# Altium footprint library Libreria_Organo.PcbLib: 19 footprints (part 1 of 2)
Each footprint in its own frame and in the unit in brackets; x right, y up, seen from the top. Pads: shape width x height; smd on the part's side, far side on the other; paste and mask are expansions set on the pad; w line width, h text height; cw(c..) or ccw(c..) is an arc to the next point about the centre after c.
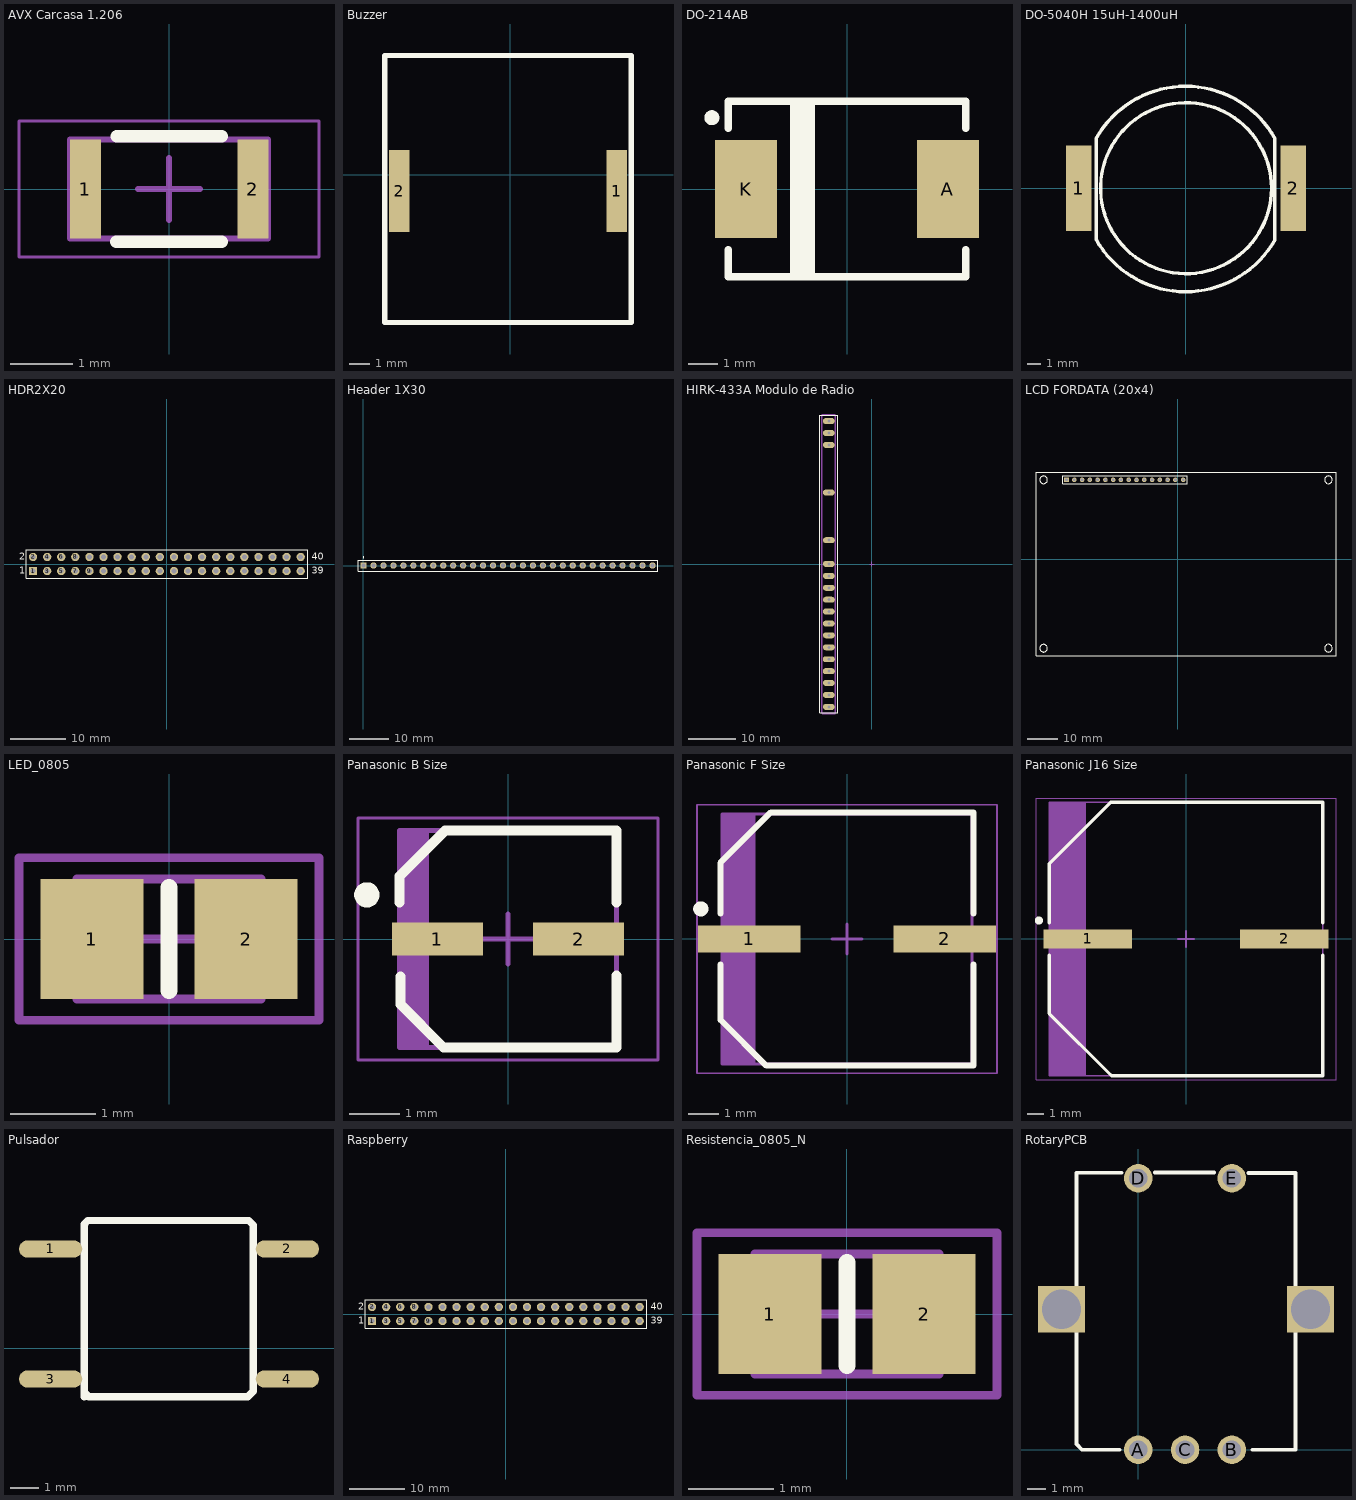
[diagram p0: the footprints below, top view; thin cyan lines are the x and y axes]

## AVX Carcasa 1.206 [mm] "Molded Capacitor, 2-Leads, Body 3,20x1,60mm, IPC Medium Density"
height 3.4
pads (2):
  rect 0.5x1.6 smd: 1(-1.352,0) 2(1.357,0)
Top Overlay:
  lines w0.2: -0.85,-0.85 -0.475,-0.85 0.475,-0.85 0.855,-0.85 ; -0.845,0.85 -0.475,0.85 0.475,0.85 0.855,0.85
Mechanical 13:
  lines w0.1: -1.6,-0.8 -1.6,0.8 1.6,0.8 1.6,-0.8 -1.6,-0.8
Mechanical 15:
  lines w0.05: -2.425,-1.1 -2.425,1.1 2.425,1.1 2.425,-1.1 -2.425,-1.1
  lines w0.1: -0.5,0 0.5,0 ; 0,-0.5 0,0.5
3D body: height 1.71, standoff 0, extent -1.7,-0.835 1.7,0.845

## Buzzer [mm]
pads (2):
  rect 1x4 smd: 1(5.2,-0.8) 2(-5.4,-0.8)
Top Overlay:
  lines w0.254: -6.1,-7.2 5.9,-7.2 5.9,5.8 -6.1,5.8 -6.1,-7.2
3D body: height 3.07, standoff 0, extent -6.051,-6.68 5.949,5.32

## DO-214AB [mm]
pads (2):
  rect 2.1x3.3 smd: A(3.4,0) K(-3.4,0)
Top Overlay:
  circle w0.254: c-4.55,2.4 r0.125
  lines w0.254: -4,-2.05 -4,-2.95 4,-2.95 4,-2.05 ; -4,2.05 -4,2.95 4,2.95 4,2.05 ; -1.8,-2.95 -1.8,2.95 ; -1.6,-2.95 -1.6,2.95 ; -1.4,-2.95 -1.4,2.95 ; -1.2,-2.95 -1.2,2.95
3D body: height 2.27, standoff -0.03, extent -3.975,-2.95 3.975,2.95

## DO-5040H 15uH-1400uH [mm] "Bobina coilcraft SMD DO-5040H válido para 15uH hasta 1400uH"
pads (2):
  rect 1.9x6.35 smd: 1(-7.95,0) 2(7.95,0)
Top Overlay:
  circle w0.254: c0,0.01 r6.34
  lines w0.254: -6.663,-3.83 -6.663,3.7 cw(c-0.03,-0.05) 6.599,3.707 ; -6.647,-3.83 ccw(c-0.03,-0.05) 6.587,-3.829 6.587,3.7
3D body: height 11.97, standoff -0.03, extent -9.143,-7.366 9.397,7.366

## HDR2X20 [mm] "Connector; Header; 20x2 Position"
pads (40):
  rect 1.5x1.5 hole 0.9: 1(-24.13,-1.27)
  round 1.5 hole 0.9: 2(-24.13,1.27) 3(-21.59,-1.27) 4(-21.59,1.27) 5(-19.05,-1.27) 6(-19.05,1.27) 7(-16.51,-1.27) 8(-16.51,1.27) 9(-13.97,-1.27) 10(-13.97,1.27) 11(-11.43,-1.27) 12(-11.43,1.27) 13(-8.89,-1.27) 14(-8.89,1.27) 15(-6.35,-1.27) 16(-6.35,1.27) 17(-3.81,-1.27) 18(-3.81,1.27) 19(-1.27,-1.27) 20(-1.27,1.27) 21(1.27,-1.27) 22(1.27,1.27) 23(3.81,-1.27) 24(3.81,1.27) 25(6.35,-1.27) 26(6.35,1.27) 27(8.89,-1.27) 28(8.89,1.27) 29(11.43,-1.27) 30(11.43,1.27) 31(13.97,-1.27) 32(13.97,1.27) 33(16.51,-1.27) 34(16.51,1.27) 35(19.05,-1.27) 36(19.05,1.27) 37(21.59,-1.27) 38(21.59,1.27) 39(24.13,-1.27) 40(24.13,1.27)
Top Overlay:
  lines w0.2: -25.4,-2.54 -25.4,2.54 25.4,2.54 25.4,-2.54 -25.4,-2.54
  text "39" at 26.162,-1.778 h1.27
  text "40" at 26.162,0.762 h1.27
  text "2" at -26.67,0.762 h1.27
  text "1" at -26.67,-1.778 h1.27
3D body: height 2.1, standoff -9, extent -25.5,-2.5 25.6,2.5

## Header 1X30 [mm]
pads (30):
  rect 1.6x1.6 hole 0.99: 1(0,0)
  round 1.6 hole 0.99: 2(2.54,0) 3(5.08,0) 4(7.62,0) 5(10.16,0) 6(12.7,0) 7(15.24,0) 8(17.78,0) 9(20.32,0) 10(22.86,0) 11(25.4,0) 12(27.94,0) 13(30.48,0) 14(33.02,0) 15(35.56,0) 16(38.1,0) 17(40.64,0) 18(43.18,0) 19(45.72,0) 20(48.26,0) 21(50.8,0) 22(53.34,0) 23(55.88,0) 24(58.42,0) 25(60.96,0) 26(63.5,0) 27(66.04,0) 28(68.58,0) 29(71.12,0) 30(73.66,0)
Top Overlay:
  circle w0.25: c0,2.05 r0.125
  lines w0.2: -1.4,-1.4 75.06,-1.4 75.06,1.4 -1.4,1.4 -1.4,-1.4
3D body: height 10.19, standoff -3.39, extent -1.389,-3.211 74.811,2.869

## HIRK-433A Modulo de Radio [mil] "CFP, 54-Leads, Body 63,50x14,50mm (max), Pitch 2,54mm, IPC Medium Density"
height 39.37
pads (18):
  oval 100x50 hole 25: 1(-362.2,1200) 2(-362.2,1100) 3(-362,1000) 7(-362.2,600) 11(-362,200) 13(-362,1) 14(-362,-100) 15(-362,-200) 16(-362,-300) 17(-362,-399) 18(-362,-500) 19(-362,-599) 20(-362,-700) 21(-362.2,-800) 22(-362.2,-900) 23(-362,-999) 24(-362,-1100) 25(-362,-1200)
Top Overlay:
  lines w7.87: -438.75,-1250 -438.75,1250 -287,1250 -287,-1250 -438.75,-1250
Mechanical 13:
  lines w3.94: -423,-1250 -423,1250 -302,1250 -302,-1250 -423,-1250
Mechanical 15:
  lines w1.97: -416.34,-1259.84 -416.34,1259.84 -309,1259.84 -309,-1259.84 -416.34,-1259.84
  lines w3.94: -19.68,0 19.69,0 ; 0,-19.68 0,19.68
3D body: height 811.81, standoff -177.17, extent -482.18,-1274.45 -239.55,1276.73

## LCD FORDATA (20x4) [mm] "LCD 4x20"
pads (16):
  rect 1.5x1.5 hole 0.9: 1(-36.297,25.923)
  round 1.5 hole 0.9: 2(-33.757,25.923) 3(-31.217,25.923) 4(-28.677,25.923) 5(-26.137,25.923) 6(-23.597,25.923) 7(-21.057,25.923) 8(-18.517,25.923) 9(-15.977,25.923) 10(-13.437,25.923) 11(-10.897,25.923) 12(-8.357,25.923) 13(-5.817,25.923) 14(-3.277,25.923) 15(-0.737,25.923) 16(1.803,25.923)
Top Overlay:
  circle w0.254: c-43.765,25.923 r1.25
  circle w0.254: c-43.765,-29.083 r1.25
  circle w0.254: c49.3,25.923 r1.25
  circle w0.254: c49.3,-29.077 r1.25
  lines w0.2: -46.265,-29.077 -46.265,-31.577 ; -43.765,28.423 -46.265,28.423 ; 49.209,28.423 51.709,28.423 ; -46.265,-31.577 51.735,-31.577 51.735,28.397 51.709,28.423 ; -46.265,-31.577 -46.265,28.423 ; -46.265,28.423 51.709,28.423 ; -43.612,28.423 -43.612,28.423 ; -37.567,24.653 3.073,24.653 3.073,27.193 -35.662,27.193 -37.567,27.193 -37.567,24.653
3D body: height 2.2, standoff -11.6, extent -46.265,-31.577 51.735,28.423

## LED_0805 [mm]
height 4.3
pads (2):
  rect 1.2x1.4 smd: 1(-0.9,0) 2(0.9,0)
Top Overlay:
  lines w0.2: 0,-0.6 0,0.6
Mechanical 13:
  lines w0.1: -1.075,-0.7 -1.075,0.7 1.075,0.7 1.075,-0.7 -1.075,-0.7
Mechanical 15:
  lines w0.1: -0.5,0 0.5,0 ; 0,-0.5 0,0.5 ; -1.75,-0.95 -1.75,0.95 1.75,0.95 1.75,-0.95 -1.75,-0.95
3D body: height 0.9, standoff -0.01, extent -1.05,-0.675 1.05,0.675

## Panasonic B Size [mm] "Molded Capacitor, 2-Leads, Body 4,30x4,30mm, IPC Medium Density"
height 1.8
pads (2):
  rect 1.8x0.65 smd: 1(-1.4,0) 2(1.4,0)
Top Overlay:
  circle w0.25: c-2.8,0.875 r0.125
  lines w0.2: -2.15,0.725 -2.15,1.245 -1.245,2.15 2.15,2.15 2.15,0.725 ; -2.134,-0.741 -2.134,-1.295 -1.279,-2.15 2.15,-2.15 2.15,-0.725
Mechanical 13:
  rectangle: -2.15,-2.15 -1.572,2.15
  lines w0.1: -2.15,-2.15 -2.15,2.15 2.15,2.15 2.15,-2.15 -2.15,-2.15
Mechanical 15:
  lines w0.05: -2.975,-2.4 -2.975,2.4 2.975,2.4 2.975,-2.4 -2.975,-2.4
  lines w0.1: -0.5,0 0.5,0 ; 0,-0.5 0,0.5
3D body: height 5.4, standoff 0, extent -2.3,-2.163 2.3,2.137

## Panasonic F Size [mm] "Molded Capacitor, 2-Leads, Body 8,30x8,30mm, IPC Medium Density"
height 3.4
pads (2):
  rect 3.4x0.9 smd: 1(-3.25,0) 2(3.25,0)
Top Overlay:
  circle w0.25: c-4.85,1 r0.125
  lines w0.2: -4.2,-0.85 -4.196,-0.854 -4.196,-2.68 -2.676,-4.2 4.2,-4.2 4.2,-0.85 ; -4.2,0.85 -4.2,2.525 -2.525,4.2 4.2,4.2 4.2,0.85
Mechanical 13:
  rectangle: -4.15,-4.15 -3.034,4.15
  lines w0.1: -4.15,-4.15 4.15,-4.15 4.15,4.15 -4.15,4.15 -4.15,-4.15
Mechanical 15:
  lines w0.05: -4.975,-4.45 4.975,-4.45 4.975,4.45 -4.975,4.45 -4.975,-4.45
  lines w0.1: -0.5,0 0.5,0 ; 0,-0.5 0,0.5
3D body: height 10.2, standoff 0, extent -4.937,-4.112 4.963,4.188

## Panasonic J16 Size [mm] "Molded Capacitor, 2-Leads, Body 17,00x17,00mm, IPC Medium Density"
height 3.4
pads (2):
  rect 5.5x1.2 smd: 1(-6.1,0) 2(6.1,0)
Top Overlay:
  circle w0.25: c-9.15,1.15 r0.125
  lines w0.2: -8.5,-1 -8.5,-4.594 -8.496,-4.597 -8.496,-4.635 -4.632,-8.5 8.5,-8.5 8.5,-1 ; -8.5,1 -8.496,1.004 -8.496,4.686 -4.683,8.5 8.5,8.5 8.5,1 ; -4.683,-8.449 -4.661,-8.471
Mechanical 13:
  rectangle: -8.5,-8.5 -6.214,8.5
  lines w0.1: -8.5,-8.5 -8.5,8.5 8.5,8.5 8.5,-8.5 -8.5,-8.5
Mechanical 15:
  lines w0.05: -9.325,-8.75 -9.325,8.75 9.325,8.75 9.325,-8.75 -9.325,-8.75
  lines w0.1: -0.5,0 0.5,0 ; 0,-0.5 0,0.5
3D body: height 16.5, standoff -0.01, extent -8.888,-8.487 8.812,8.513

## Pulsador [mm]
pads (4):
  oval 2.2x0.6 smd: 1(3.15,3.454) 2(11.379,3.454) 3(3.15,-1.067) 4(11.379,-1.067)
Top Overlay:
  lines w0.254: 4.318,-1.682 4.318,4.318 4.445,4.445 10.033,4.445 10.191,4.287 10.191,-1.491 10,-1.682 4.476,-1.682 4.318,-1.524
3D body: height 4.3, standoff 0, extent 3.341,-1.929 11.341,4.571

## Raspberry [mm] "Connector; Header; 20x2 Position"
pads (40):
  rect 1.5x1.5 hole 0.9: 1(-24.13,-1.27)
  round 1.5 hole 0.9: 2(-24.13,1.27) 3(-21.59,-1.27) 4(-21.59,1.27) 5(-19.05,-1.27) 6(-19.05,1.27) 7(-16.51,-1.27) 8(-16.51,1.27) 9(-13.97,-1.27) 10(-13.97,1.27) 11(-11.43,-1.27) 12(-11.43,1.27) 13(-8.89,-1.27) 14(-8.89,1.27) 15(-6.35,-1.27) 16(-6.35,1.27) 17(-3.81,-1.27) 18(-3.81,1.27) 19(-1.27,-1.27) 20(-1.27,1.27) 21(1.27,-1.27) 22(1.27,1.27) 23(3.81,-1.27) 24(3.81,1.27) 25(6.35,-1.27) 26(6.35,1.27) 27(8.89,-1.27) 28(8.89,1.27) 29(11.43,-1.27) 30(11.43,1.27) 31(13.97,-1.27) 32(13.97,1.27) 33(16.51,-1.27) 34(16.51,1.27) 35(19.05,-1.27) 36(19.05,1.27) 37(21.59,-1.27) 38(21.59,1.27) 39(24.13,-1.27) 40(24.13,1.27)
Top Overlay:
  lines w0.2: -25.4,-2.54 -25.4,2.54 25.4,2.54 25.4,-2.54 -25.4,-2.54
  text "39" at 26.162,-1.778 h1.27
  text "40" at 26.162,0.762 h1.27
  text "2" at -26.67,0.762 h1.27
  text "1" at -26.67,-1.778 h1.27
3D body: height -3.4, standoff -14.5, extent -25.298,-2.602 25.802,2.398
3D body: height 1.6, standoff -9.5, extent -25.298,-2.602 25.802,2.398
3D body: height -6.4, standoff -25.15, extent -34.645,-54.658 54.975,3.642
3D body: height 11.3, standoff 0.2, extent -25.298,-2.602 25.802,2.398

## Resistencia_0805_N [mm] "Chip Resistor, Body 2.0x1.2mm, IPC Medium Density"
height 0.7
pads (2):
  rect 1.2x1.4 smd: 1(-0.9,0) 2(0.9,0)
Top Overlay:
  lines w0.2: 0,-0.6 0,0.6
Mechanical 13:
  lines w0.1: -1.075,-0.7 1.075,-0.7 1.075,0.7 -1.075,0.7 -1.075,-0.7
Mechanical 15:
  lines w0.1: -0.5,0 0.5,0 ; 0,-0.5 0,0.5 ; -1.75,-0.95 1.75,-0.95 1.75,0.95 -1.75,0.95 -1.75,-0.95
3D body: height 0.78, standoff 0, extent -0.974,-0.625 1.026,0.625

## RotaryPCB [mm]
pads (7):
  round 1.524 hole 1: A(0,0) B(5,0) C(2.5,0) D(0,14.5) E(5,14.5)
  rect 2.5x2.5 hole 2.1 square unplated: ""(-4.1,7.5) ""(9.2,7.5)
Top Overlay:
  lines w0.2: -1,0 -3,0 -3.3,0.3 -3.3,14.8 -2.7,14.8 -0.9,14.8 ; 0.889,14.808 4.064,14.808 ; 5.893,14.783 8.393,14.783 ; 6.1,0 8.4,0 8.4,14.7
3D body: height 24.5, standoff -1.2, extent -4.934,-1.507 10.066,16.493